# Altium footprint library LDCN Components.PcbLib: 426 footprints (part 19 of 27)
Each footprint in its own frame and in the unit in brackets; x right, y up, seen from the top. Pads: shape width x height; smd on the part's side, far side on the other; paste and mask are expansions set on the pad; w line width, h text height; cw(c..) or ccw(c..) is an arc to the next point about the centre after c.
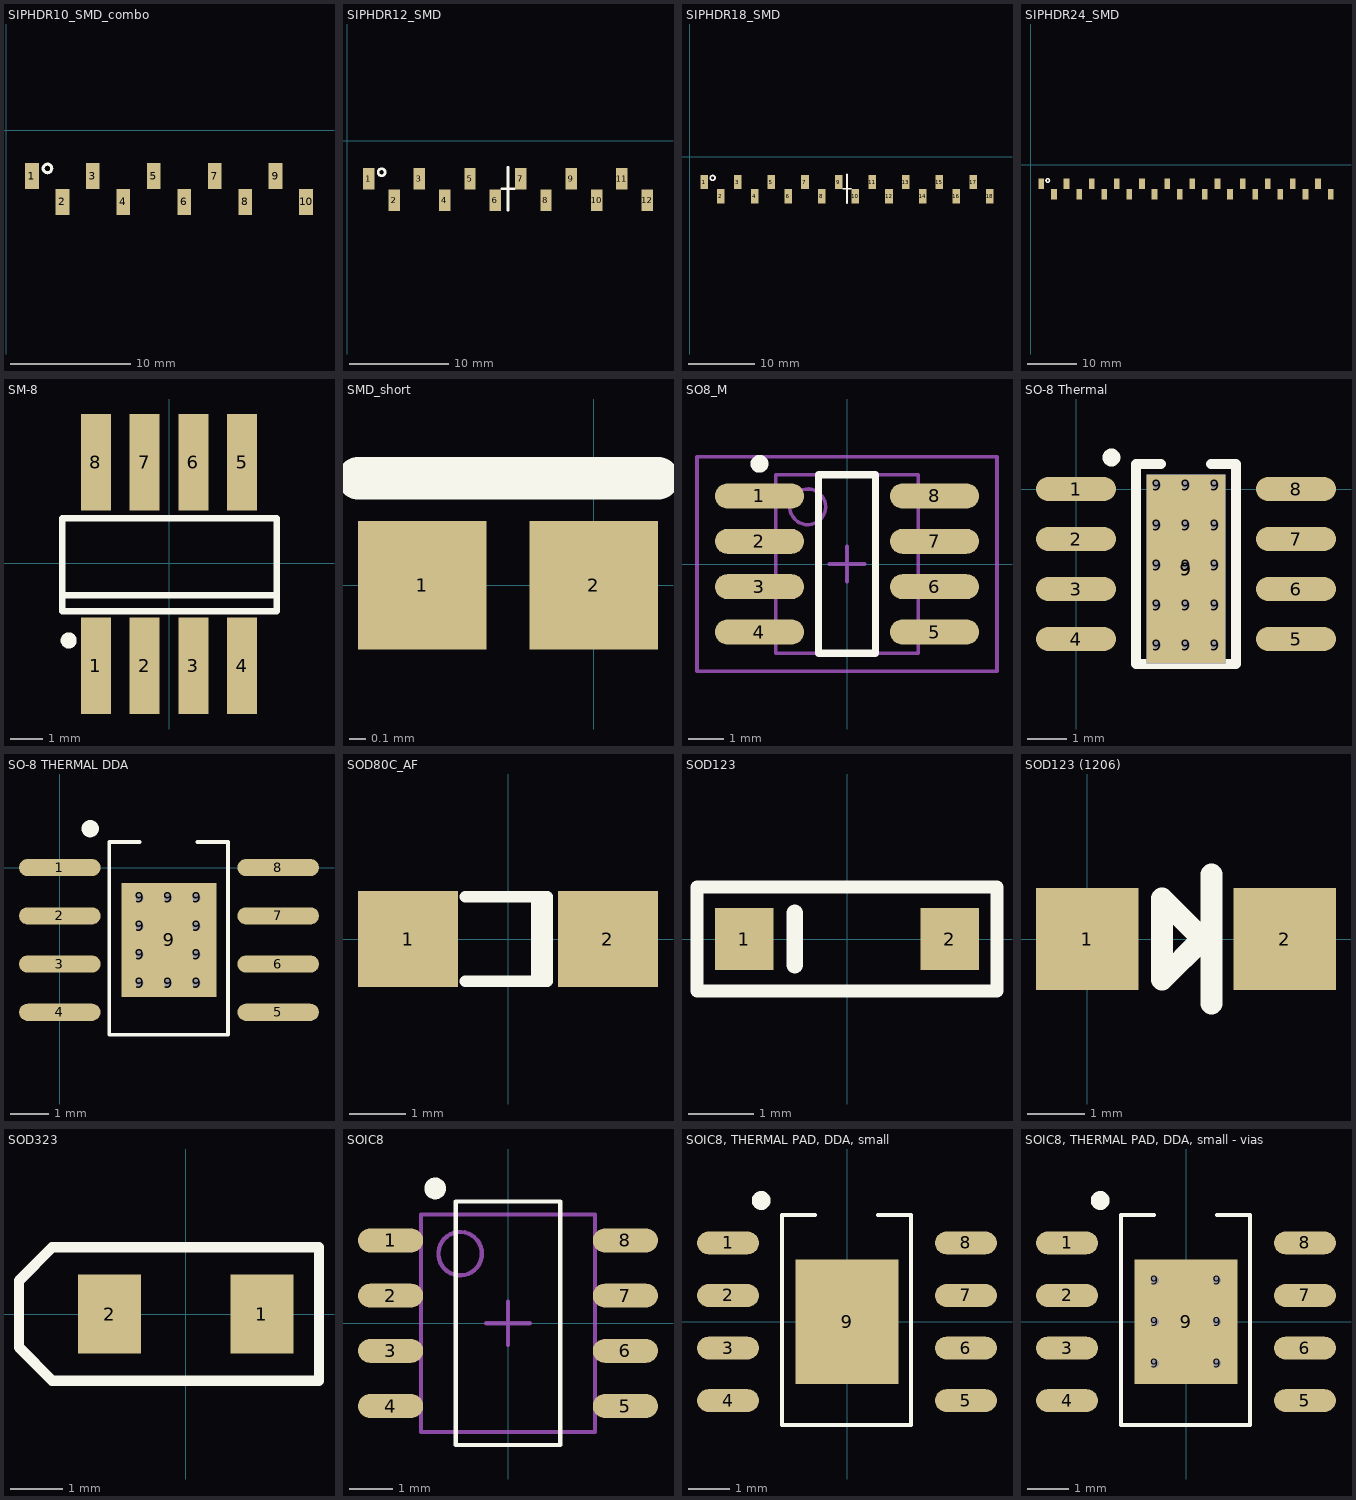
[diagram p18: the footprints below, top view; thin cyan lines are the x and y axes]

## SIPHDR10_SMD_combo [mil]
height 196.85
pads (10):
  rect 45x85 smd: 1(85,-150) 2(185,-235) 3(285,-150) 4(385,-235) 5(485,-150) 6(585,-235) 7(685,-150) 8(785,-235) 9(885,-150) 10(985,-235)
Top Overlay:
  circle w10: c135.86,-125 r14.14

## SIPHDR12_SMD [mil]
height 196.85
pads (12):
  rect 45x85 smd: 1(85,-150) 2(185,-235) 3(285,-150) 4(385,-235) 5(485,-150) 6(585,-235) 7(685,-150) 8(785,-235) 9(885,-150) 10(985,-235) 11(1085,-150) 12(1185,-235)
Top Overlay:
  circle w10: c135.86,-125 r14.14
  lines w10: 610,-190 660,-190 ; 635,-275 635,-105

## SIPHDR18_SMD [mil]
height 196.85
pads (18):
  rect 45x85 smd: 1(85,-150) 2(185,-235) 3(285,-150) 4(385,-235) 5(485,-150) 6(585,-235) 7(685,-150) 8(785,-235) 9(885,-150) 10(985,-235) 11(1085,-150) 12(1185,-235) 13(1285,-150) 14(1385,-235) 15(1485,-150) 16(1585,-235) 17(1685,-150) 18(1785,-235)
Top Overlay:
  circle w10: c135.86,-125 r14.14
  lines w10: 910,-190 960,-190 ; 935,-275 935,-105

## SIPHDR24_SMD [mil]
height 196.85
pads (24):
  rect 45x85 smd: 1(85,-150) 2(185,-235) 3(285,-150) 4(385,-235) 5(485,-150) 6(585,-235) 7(685,-150) 8(785,-235) 9(885,-150) 10(985,-235) 11(1085,-150) 12(1185,-235) 13(1285,-150) 14(1385,-235) 15(1485,-150) 16(1585,-235) 17(1685,-150) 18(1785,-235) 19(1885,-150) 20(1985,-235) 21(2085,-150) 22(2185,-235) 23(2285,-150) 24(2385,-235)
Top Overlay:
  circle w10: c135.86,-125 r14.14

## SM-8 [mil] "SOT223 with 8 Leads"
height 70.87
pads (8):
  rect 37x119 smd: 1(-90.55,-125.98) 2(-30.55,-125.98) 3(29.45,-125.98) 4(89.45,-125.98) 5(89.45,124.02) 6(29.45,124.02) 7(-30.55,124.02) 8(-90.55,124.02)
Top Overlay:
  circle w9.84: c-123.92,-95 r4.92
  lines w7.87: -131.89,-39.37 131.89,-39.37 ; -131.89,-59.06 -131.89,55.12 131.89,55.12 131.89,-59.06 -131.89,-59.06

## SMD_short [mil]
pads (2):
  rect 30x30 smd: 1(-40,0) 2(0,0)
Top Overlay:
  lines w10: -55,25 15,25

## SO8_M [mm] "SOIC, 8-Leads, Body 4.9x3.9mm, Pitch 1.27mm, IPC Low Density"
height 1.75
pads (8):
  oval 2.5x0.7 smd: 1(-2.45,1.905) 2(-2.45,0.635) 3(-2.45,-0.635) 4(-2.45,-1.905) 5(2.45,-1.905) 6(2.45,-0.635) 7(2.45,0.635) 8(2.45,1.905)
Top Overlay:
  circle w0.25: c-2.45,2.805 r0.125
  lines w0.2: -0.8,-2.5 0.8,-2.5 0.8,2.5 -0.8,2.5 -0.8,-2.5
Mechanical 13:
  circle w0.1: c-1.1,1.6 r0.5
  lines w0.1: -2,-2.5 2,-2.5 2,2.5 -2,2.5 -2,-2.5
Mechanical 15:
  lines w0.1: -0.5,0 0.5,0 ; 0,-0.5 0,0.5 ; -4.2,-3 4.2,-3 4.2,3 -4.2,3 -4.2,-3
3D body: height 1.75, standoff 0, extent -2,-2.5 2,2.5
3D body "SOIC08 narrow.stp": height 2, standoff 0, extent -3.157,-2.481 3.006,2.519

## SO-8 Thermal [mm] "SO-8 Package with a thermal pad"
height 3
pads (25):
  oval 2.032x0.61 smd: 1(0,0) 2(0,-1.27) 3(0,-2.54) 4(0,-3.81) 5(5.588,-3.81) 6(5.588,-2.54) 7(5.588,-1.27) 8(5.588,0)
  round 0.5 hole 0.2: 9(2.06,-3.964) 9(2.06,-2.948) 9(2.06,-1.932) 9(2.06,-0.916) 9(2.06,0.1) 9(2.8,-3.964) 9(2.8,-2.948) 9(2.8,-1.932) 9(2.8,-0.916) 9(2.8,0.1) 9(3.531,-3.962) 9(3.531,-2.946) 9(3.531,-1.93) 9(3.531,-0.914) 9(3.531,0.102)
  rect 2x4.8 smd: 9(2.794,-2.032)
  rect 2x4.8 smd far side: 9(2.794,-2.032)
Top Overlay:
  circle w0.254: c0.9,0.8 r0.1
  lines w0.254: 2.159,0.635 1.524,0.635 1.524,-4.445 4.064,-4.445 4.064,0.635 3.429,0.635

## SO-8 THERMAL DDA [mm] "SO-8, Thermal Pad, Body 4.9mm x 3.9mm, Pitch 1.27mm"
height 1.7
pads (19):
  oval 2.15x0.45 smd: 1(0,0) 2(0,-1.27) 3(0,-2.54) 4(0,-3.81) 5(5.75,-3.81) 6(5.75,-2.54) 7(5.75,-1.27) 8(5.75,0)
  round 0.5 hole 0.2: 9(2.1,-3.05) 9(2.1,-2.3) 9(2.1,-1.55) 9(2.1,-0.8) 9(2.85,-3.05) 9(2.85,-0.8) 9(3.6,-3.05) 9(3.6,-2.3) 9(3.6,-1.55) 9(3.6,-0.8)
  rect 2.49x3 smd: 9(2.875,-1.905)
Top Overlay:
  circle w0.254: c0.8,1.025 r0.1
  lines w0.1: 2.1,0.675 1.3,0.675 1.3,-4.4 4.425,-4.4 4.425,0.675 3.625,0.675
3D body "SOIC08 narrow.stp": height 2, standoff 0, extent -0.207,-4.405 5.957,0.595

## SOD80C_AF [mil] "Metal Electrode Face (MELF) Diode; Body 3.5 x 1.6 mm (LxDia)"
height 62.99
pads (2):
  rect 70x66.93 smd: 1(-70,0) 2(70,0)
Top Overlay:
  lines w7.87: -30,-29.53 27.48,-29.53 27.48,29.53 -30,29.53 ; 20,-29.53 20,29.53

## SOD123 [mm]
pads (2):
  rect 0.9x0.95 smd: 1(-1.575,0) 2(1.575,0)
Top Overlay:
  lines w0.2: -2.3,-0.8 2.3,-0.8 2.3,0.8 -2.3,0.8 -2.3,-0.8
  lines w0.254: -0.8,-0.4 -0.8,0.4

## SOD123 (1206) [mil] "Diode"
pads (2):
  rect 70x70 smd: 1(0,0) 2(135,0)
Top Overlay:
  lines w15: 85,-43.94 85,43.94 ; 85,-7.87 85,-6.26 51.18,27.56 51.18,-27.56 78.74,0 85,0

## SOD323 [mm]
pads (2):
  rect 1.2x1.5 smd: 1(1.45,0) 2(-1.45,0)
Top Overlay:
  lines w0.2: -3.175,-0.635 -2.54,-1.27 2.54,-1.27 2.54,1.27 -2.54,1.27 -3.175,0.635 -3.175,-0.635

## SOIC8 [mm] "SOIC, 8-Leads, Body 4.9x3.9mm, Pitch 1.27mm"
height 1.75
pads (8):
  oval 1.5x0.55 smd: 1(-2.7,1.905) 2(-2.7,0.635) 3(-2.7,-0.635) 4(-2.7,-1.905) 5(2.7,-1.905) 6(2.7,-0.635) 7(2.7,0.635) 8(2.7,1.905)
Top Overlay:
  circle w0.25: c-1.675,3.1 r0.125
  lines w0.1: -1.2,-2.8 -1.2,2.8 1.2,2.8 1.2,-2.8 -1.2,-2.8
Mechanical 13:
  circle w0.1: c-1.1,1.6 r0.5
  lines w0.1: -2,-2.5 -2,2.5 2,2.5 2,-2.5 -2,-2.5
Mechanical 15:
  lines w0.1: -0.5,0 0.5,0 ; 0,-0.5 0,0.5
3D body "SOIC08 narrow.stp": height 2, standoff 0, extent -3.082,-2.5 3.082,2.5

## SOIC8, THERMAL PAD, DDA, small [mm] "SO-8, Thermal Pad, Body 4.9mm x 3.9mm, Pitch 1.27mm"
height 1.7
pads (9):
  oval 1.5x0.55 smd: 1(-2.875,1.905) 2(-2.875,0.635) 3(-2.875,-0.635) 4(-2.875,-1.905) 5(2.875,-1.905) 6(2.875,-0.635) 7(2.875,0.635) 8(2.875,1.905)
  rect 2.49x3 smd: 9(0,0)
Top Overlay:
  circle w0.254: c-2.075,2.93 r0.1
  lines w0.1: -0.775,2.58 -1.575,2.58 -1.575,-2.495 1.55,-2.495 1.55,2.58 0.75,2.58
3D body "SOIC08 narrow.stp": height 2, standoff 0, extent -3.082,-2.5 3.082,2.5

## SOIC8, THERMAL PAD, DDA, small - vias [mm] "SO-8, Thermal Pad, Body 4.9mm x 3.9mm, Pitch 1.27mm"
height 1.7
pads (15):
  oval 1.5x0.55 smd: 1(-2.875,1.905) 2(-2.875,0.635) 3(-2.875,-0.635) 4(-2.875,-1.905) 5(2.875,-1.905) 6(2.875,-0.635) 7(2.875,0.635) 8(2.875,1.905)
  round 0.4 hole 0.2: 9(-0.75,-1) 9(-0.75,0) 9(-0.75,1) 9(0.75,-1) 9(0.75,0) 9(0.75,1)
  rect 2.49x3 smd: 9(0,0)
Top Overlay:
  circle w0.254: c-2.075,2.93 r0.1
  lines w0.1: -0.775,2.58 -1.575,2.58 -1.575,-2.495 1.55,-2.495 1.55,2.58 0.75,2.58
3D body "SOIC08 narrow.stp": height 2, standoff 0, extent -3.082,-2.5 3.082,2.5